# Altium footprint library elk-pi-Sika_revb.PcbLib: 102 footprints (part 3 of 7)
Each footprint in its own frame and in the unit in brackets; x right, y up, seen from the top. Pads: shape width x height; smd on the part's side, far side on the other; paste and mask are expansions set on the pad; w line width, h text height; cw(c..) or ccw(c..) is an arc to the next point about the centre after c.
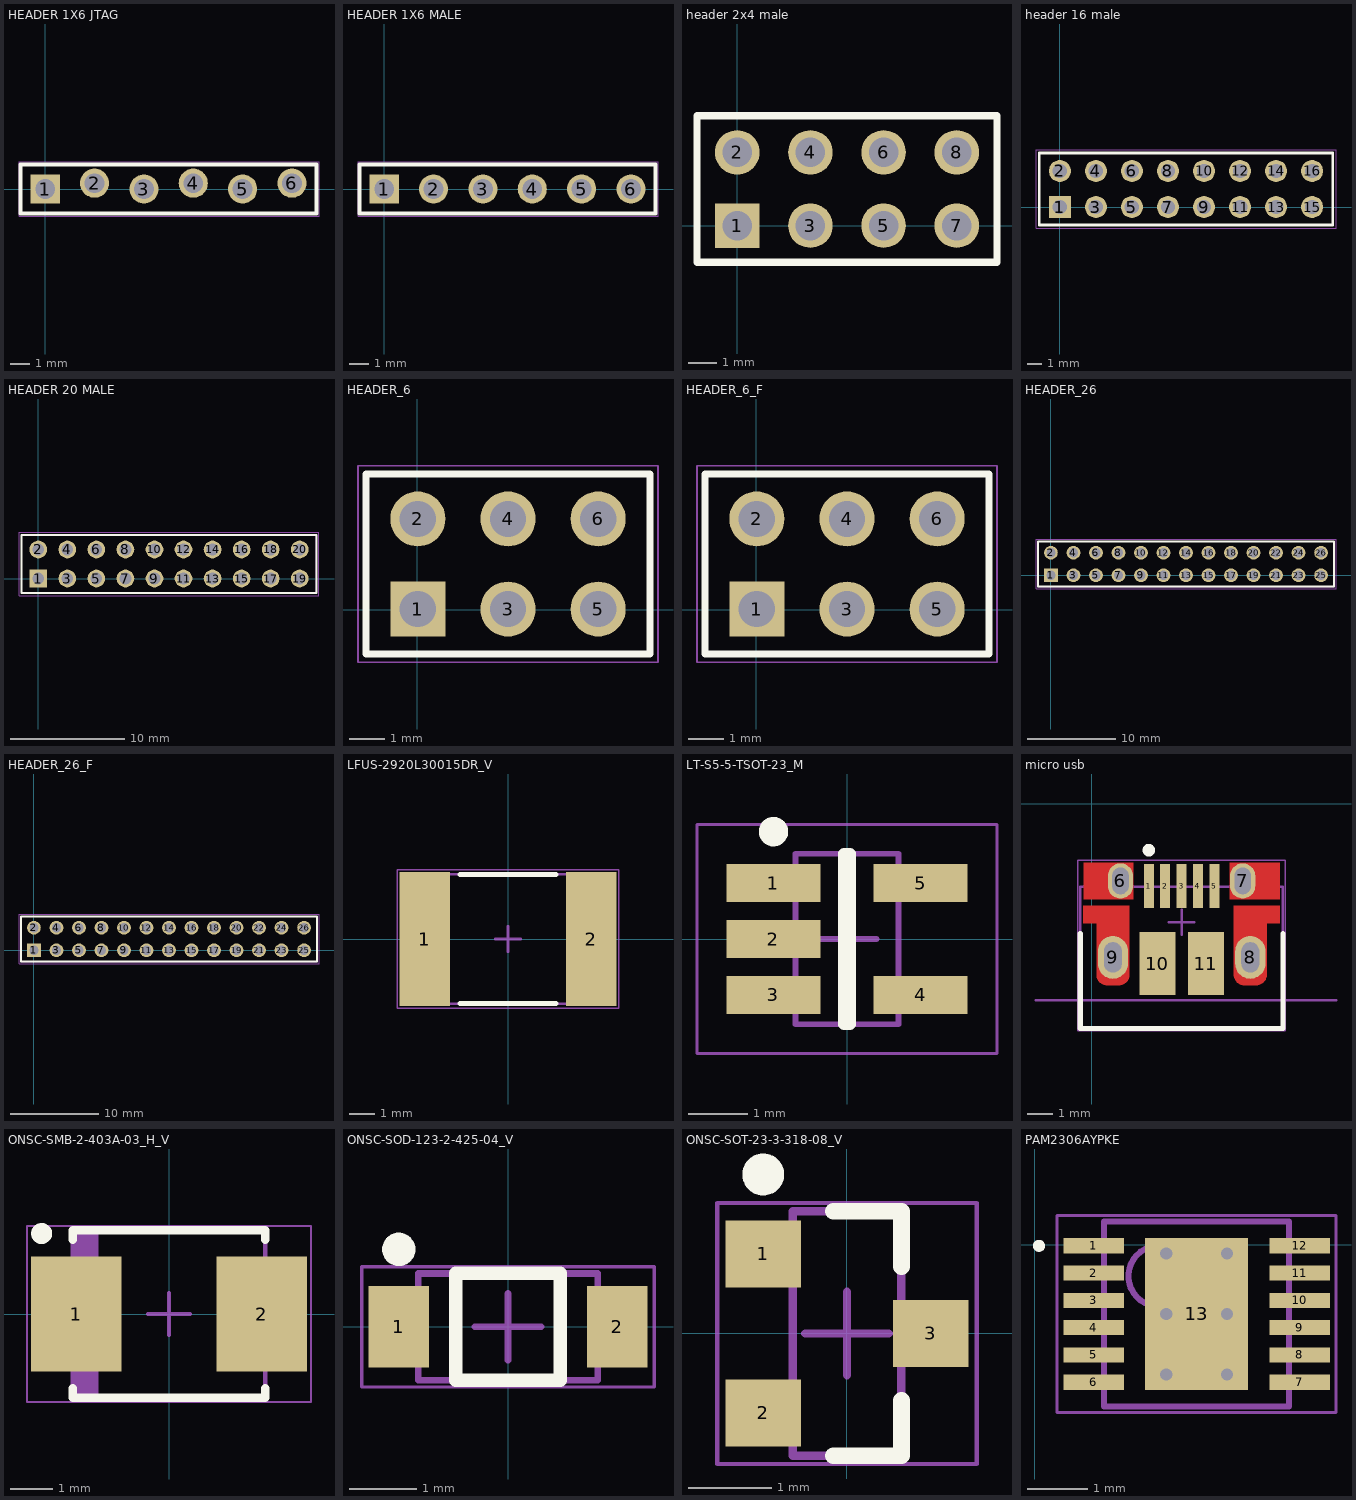
[diagram p2: the footprints below, top view; thin cyan lines are the x and y axes]

## HEADER 1X6 JTAG [mm] "2.54 MM"
height 8.5
pads (6):
  rect 1.5x1.5 hole 1.02: 1(0,0)
  round 1.5 hole 1.02: 2(2.54,0.3) 3(5.08,0) 4(7.62,0.3) 5(10.16,0) 6(12.7,0.3)
Top Overlay:
  lines w0.2: -1.27,-1.27 13.97,-1.27 13.97,1.27 -1.27,1.27 -1.27,-1.27
Mechanical 13:
  lines w0.1: -1.25,-1.3 13.99,-1.3 13.99,1.3 -1.25,1.3 -1.25,-1.3
Mechanical 15:
  lines w0.05: -1.35,-1.4 -1.35,1.4 14.09,1.4 14.09,-1.4 -1.35,-1.4

## HEADER 1X6 MALE [mm] "2.54 MM"
height 8.5
pads (6):
  rect 1.5x1.5 hole 1.02: 1(0,0)
  round 1.5 hole 1.02: 2(2.54,0) 3(5.08,0) 4(7.62,0) 5(10.16,0) 6(12.7,0)
Top Overlay:
  lines w0.2: -1.27,-1.27 13.97,-1.27 13.97,1.27 -1.27,1.27 -1.27,-1.27
Mechanical 13:
  lines w0.1: -1.25,-1.3 13.99,-1.3 13.99,1.3 -1.25,1.3 -1.25,-1.3
Mechanical 15:
  lines w0.05: -1.35,-1.4 -1.35,1.4 14.09,1.4 14.09,-1.4 -1.35,-1.4
3D body "DS1021-1x6S61.stp": height 8.6, standoff -3, extent -1.27,-1.27 13.97,1.27

## header 2x4 male [mm] "header, 2x4 Pins, Vertical, 2.54mm Pitch, Male"
height 9.27
pads (8):
  rect 1.55x1.55 hole 1.02: 1(0,0)
  round 1.55 hole 1.02: 2(0,2.54) 3(2.54,0) 4(2.54,2.54) 5(5.08,0) 6(5.08,2.54) 7(7.62,0) 8(7.62,2.54)
Top Overlay:
  lines w0.254: -1.397,-1.27 9.017,-1.27 9.017,3.81 -1.397,3.81 -1.397,-1.27
3D body "DS1021-2x4S61.stp": height 8.6, standoff -3, extent -1.27,-1.23 8.89,3.77

## header 16 male [mm] "unshrouded"
height 28.65
pads (16):
  rect 1.55x1.55 hole 1.02: 1(0,0)
  round 1.55 hole 1.02: 2(0,2.54) 3(2.54,0) 4(2.54,2.54) 5(5.08,0) 6(5.08,2.54) 7(7.62,0) 8(7.62,2.54) 9(10.16,0) 10(10.16,2.54) 11(12.7,0) 12(12.7,2.54) 13(15.24,0) 14(15.24,2.54) 15(17.78,0) 16(17.78,2.54)
Top Overlay:
  lines w0.2: -1.46,-1.27 19.24,-1.27 19.24,3.81 -1.46,3.81 -1.46,-1.27
Mechanical 13:
  lines w0.1: -1.46,-1.27 19.24,-1.27 19.24,3.81 -1.46,3.81 -1.46,-1.27
Mechanical 15:
  lines w0.05: -1.685,-1.495 19.465,-1.495 19.465,4.035 -1.685,4.035 -1.685,-1.495
3D body "DS1021-2x8S61.stp": height 8.6, standoff -3, extent -1.275,-1.175 19.045,3.825

## HEADER 20 MALE [mm] "2.54 MM"
height 3.327
pads (20):
  rect 1.55x1.55 hole 1.02: 1(0,0)
  round 1.55 hole 1.02: 2(0,2.54) 3(2.54,0) 4(2.54,2.54) 5(5.08,0) 6(5.08,2.54) 7(7.62,0) 8(7.62,2.54) 9(10.16,0) 10(10.16,2.54) 11(12.7,0) 12(12.7,2.54) 13(15.24,0) 14(15.24,2.54) 15(17.78,0) 16(17.78,2.54) 17(20.32,0) 18(20.32,2.54) 19(22.86,0) 20(22.86,2.54)
Top Overlay:
  lines w0.2: -1.46,-1.27 -1.46,3.81 24.32,3.81 24.32,-1.27 -1.46,-1.27
Mechanical 13:
  lines w0.1: -1.46,-1.27 24.32,-1.27 24.32,3.81 -1.46,3.81 -1.46,-1.27
Mechanical 15:
  lines w0.05: -1.685,-1.495 -1.685,4.035 24.545,4.035 24.545,-1.495 -1.685,-1.495
3D body "DS1021-2x10S61.stp": height 8.6, standoff -3, extent -1.27,-1.23 24.13,3.77

## HEADER_6 [mm] "2.54 MM"
height 8.5
pads (6):
  rect 1.55x1.55 hole 1.02: 1(0.022,0.02)
  round 1.55 hole 1.02: 2(0.022,2.56) 3(2.562,0.02) 4(2.562,2.56) 5(5.102,0.02) 6(5.102,2.56)
Top Overlay:
  lines w0.2: -1.438,-1.25 6.562,-1.25 6.562,3.83 -1.438,3.83 -1.438,-1.25
Mechanical 13:
  lines w0.1: -1.438,-1.25 6.562,-1.25 6.562,3.83 -1.438,3.83 -1.438,-1.25
Mechanical 15:
  lines w0.05: -1.663,-1.475 6.787,-1.475 6.787,4.055 -1.663,4.055 -1.663,-1.475
3D body "m20-9980345_asm.stp": height 8.65, standoff -3.03, extent -1.248,-1.3 6.372,3.78

## HEADER_6_F [mm] "2.54 MM"
height 8.5
pads (6):
  rect 1.55x1.55 hole 1.02: 1(0.022,0.02)
  round 1.55 hole 1.02: 2(0.022,2.56) 3(2.562,0.02) 4(2.562,2.56) 5(5.102,0.02) 6(5.102,2.56)
Top Overlay:
  lines w0.2: -1.438,-1.25 -1.438,3.83 6.562,3.83 6.562,-1.25 -1.438,-1.25
Mechanical 13:
  lines w0.1: -1.438,-1.25 -1.438,3.83 6.562,3.83 6.562,-1.25 -1.438,-1.25
Mechanical 15:
  lines w0.05: -1.663,-1.475 -1.663,4.055 6.787,4.055 6.787,-1.475 -1.663,-1.475
3D body "m20-7830346_asm.stp": height 8.51, standoff -2.99, extent -1.448,-1.3 6.572,3.74

## HEADER_26 [mm] "Assembly .025\" [.64] SQ Post Terminal Strip, 2x13 Pins, Vertical, 2.54mm Pitch, Male"
height 5.41
pads (26):
  rect 1.55x1.55 hole 1.02: 1(0,0)
  round 1.55 hole 1.02: 2(0,2.54) 3(2.54,0) 4(2.54,2.54) 5(5.08,0) 6(5.08,2.54) 7(7.62,0) 8(7.62,2.54) 9(10.16,0) 10(10.16,2.54) 11(12.7,0) 12(12.7,2.54) 13(15.24,0) 14(15.24,2.54) 15(17.78,0) 16(17.78,2.54) 17(20.32,0) 18(20.32,2.54) 19(22.86,0) 20(22.86,2.54) 21(25.4,0) 22(25.4,2.54) 23(27.94,0) 24(27.94,2.54) 25(30.48,0) 26(30.48,2.54)
Top Overlay:
  lines w0.2: -1.46,-1.27 31.94,-1.27 31.94,3.81 -1.46,3.81 -1.46,-1.27
Mechanical 13:
  lines w0.1: -1.46,-1.27 31.94,-1.27 31.94,3.81 -1.46,3.81 -1.46,-1.27
Mechanical 15:
  lines w0.05: -1.685,-1.495 32.165,-1.495 32.165,4.035 -1.685,4.035 -1.685,-1.495
3D body "m20-9981345_asm.stp": height 8.65, standoff -3.03, extent -1.27,-1.3 31.75,3.78

## HEADER_26_F [mm] "Assembly .025\" [.64] SQ Post Terminal Strip, 2x13 Pins, Vertical, 2.54mm Pitch, Male"
height 5.41
pads (26):
  rect 1.55x1.55 hole 1.02: 1(0,0)
  round 1.55 hole 1.02: 2(0,2.54) 3(2.54,0) 4(2.54,2.54) 5(5.08,0) 6(5.08,2.54) 7(7.62,0) 8(7.62,2.54) 9(10.16,0) 10(10.16,2.54) 11(12.7,0) 12(12.7,2.54) 13(15.24,0) 14(15.24,2.54) 15(17.78,0) 16(17.78,2.54) 17(20.32,0) 18(20.32,2.54) 19(22.86,0) 20(22.86,2.54) 21(25.4,0) 22(25.4,2.54) 23(27.94,0) 24(27.94,2.54) 25(30.48,0) 26(30.48,2.54)
Top Overlay:
  lines w0.2: -1.46,-1.27 31.94,-1.27 31.94,3.81 -1.46,3.81 -1.46,-1.27
Mechanical 13:
  lines w0.1: -1.46,-1.27 31.94,-1.27 31.94,3.81 -1.46,3.81 -1.46,-1.27
Mechanical 15:
  lines w0.05: -1.685,-1.495 32.165,-1.495 32.165,4.035 -1.685,4.035 -1.685,-1.495
3D body "m20-7831342_asm.stp": height 8.51, standoff -2.99, extent -1.52,-1.32 31.9,3.72

## LFUS-2920L30015DR_V [mm] "SMD, 2-Leads, Body 5.12x7.355mm"
height 1.25
pads (2):
  rect 2x5.3 smd: 1(-3.3,0) 2(3.3,0)
Top Overlay:
  lines w0.2: -1.9,-2.56 1.9,-2.56 ; -1.9,2.56 1.9,2.56
Mechanical 13:
  lines w0.1: -3.678,-2.56 3.678,-2.56 3.678,2.56 -3.678,2.56 -3.678,-2.56
Mechanical 15:
  lines w0.05: -4.4,-2.75 4.4,-2.75 4.4,2.75 -4.4,2.75 -4.4,-2.75
  lines w0.1: -0.5,0 0.5,0 ; 0,-0.5 0,0.5
3D body: height 1.25, standoff 0, extent -3.677,-2.559 3.677,2.559

## LT-S5-5-TSOT-23_M [mm] "SOT23, 5-Leads, Body 2.90x1.63mm, Pitch 0.95mm, IPC Low Density"
height 1
pads (5):
  rect 1.6x0.65 smd: 1(-1.25,0.95) 2(-1.25,0) 3(-1.25,-0.95) 4(1.25,-0.95) 5(1.25,0.95)
Top Overlay:
  circle w0.25: c-1.25,1.825 r0.125
  lines w0.2: -0.05,-1.45 0.05,-1.45 0.05,1.45 -0.05,1.45 -0.05,-1.45
Mechanical 13:
  lines w0.1: -0.875,-1.45 -0.875,1.45 0.875,1.45 0.875,-1.45 -0.875,-1.45
Mechanical 15:
  lines w0.05: -2.55,-1.95 -2.55,1.95 2.55,1.95 2.55,-1.95 -2.55,-1.95
  lines w0.1: -0.5,0 0.5,0 ; 0,-0.5 0,0.5
3D body: height 1, standoff 0.01, extent -0.875,-1.45 0.875,1.45

## micro usb [mm]
pads (11):
  rect 0.4x1.75 smd: 1(2.256,-3.264) 2(2.906,-3.264) 3(3.556,-3.264) 4(4.206,-3.264) 5(4.856,-3.264)
  oval 1x1.4 hole 0.65 slot 1.05 at 90 deg: 6(1.131,-3.059) 7(5.981,-3.059)
  oval 1.2x1.7 hole 0.7 slot 1.2 at 90 deg: 8(6.281,-6.089) 9(0.831,-6.089)
  rect 1.425x2.5 smd: 10(2.594,-6.339) 11(4.518,-6.339)
Top Layer:
  region: 7.456,-2.329 5.456,-2.329 5.456,-3.789 7.456,-3.789
  rectangle: -0.344,-3.789 1.656,-2.329
  region: 6.931,-4.739 6.931,-6.789 6.929,-6.828 6.925,-6.866 6.921,-6.884 6.915,-6.902 6.904,-6.938 6.885,-6.976 6.864,-7.011 6.84,-7.043 6.814,-7.073 6.783,-7.1 6.75,-7.125 6.714,-7.145 6.677,-7.163 6.636,-7.176 6.605,-7.182 6.568,-7.187 6.531,-7.189 6.031,-7.189 5.988,-7.187 5.947,-7.18 5.907,-7.17 5.868,-7.155 5.836,-7.138 5.805,-7.12 5.773,-7.095 5.746,-7.069 5.72,-7.041 5.699,-7.011 5.677,-6.976 5.661,-6.94 5.649,-6.908 5.644,-6.891 5.64,-6.874 5.636,-6.854 5.632,-6.833 5.631,-6.811 5.631,-6.789 5.631,-4.739 5.631,-4.039 7.456,-4.039 7.456,-4.739
  region: 0.181,-4.739 0.181,-6.789 0.183,-6.828 0.187,-6.866 0.191,-6.884 0.197,-6.902 0.208,-6.938 0.227,-6.976 0.248,-7.011 0.272,-7.043 0.298,-7.073 0.329,-7.1 0.362,-7.125 0.398,-7.145 0.435,-7.163 0.476,-7.176 0.507,-7.182 0.544,-7.187 0.581,-7.189 1.081,-7.189 1.124,-7.187 1.165,-7.181 1.205,-7.17 1.244,-7.155 1.276,-7.138 1.307,-7.12 1.339,-7.096 1.366,-7.069 1.392,-7.041 1.413,-7.011 1.435,-6.976 1.451,-6.94 1.463,-6.908 1.468,-6.891 1.472,-6.874 1.476,-6.854 1.48,-6.833 1.481,-6.811 1.481,-6.789 1.481,-4.739 1.481,-4.039 -0.344,-4.039 -0.344,-4.739
Top Overlay:
  circle w0.25: c2.256,-1.839 r0.125
  lines w0.2: -0.464,-6.776 -0.464,-8.909 ; -0.464,-5.139 -0.464,-8.909 ; 7.576,-5.139 7.576,-8.909 -0.464,-8.909
Mechanical 1:
  lines w0.1: -2.219,-7.789 9.681,-7.789
  text "PCB Edge" at 7.981,-7.529 h0.75
Mechanical 13:
  lines w0.1: -0.464,-8.909 -0.464,-3.289 7.576,-3.289 7.576,-8.909 -0.464,-8.909
Mechanical 15:
  lines w0.05: -0.564,-9.009 -0.564,-2.229 7.676,-2.229 7.676,-9.009 -0.564,-9.009
  lines w0.1: 3.056,-4.699 4.056,-4.699 ; 3.556,-5.199 3.556,-4.199
3D body "10103594.stp": height 2.9, standoff -0.7, extent -0.464,-8.848 7.576,-2.815

## ONSC-SMB-2-403A-03_H_V [mm] "Molded, 2-Leads, Body 4.6x3.95mm"
height 2.42
pads (2):
  rect 2.159x2.743 smd: 1(-2.21,0) 2(2.21,0)
Top Overlay:
  circle w0.25: c-3.04,1.921 r0.125
  lines w0.2: -2.3,-1.772 -2.3,-2 2.3,-2 2.3,-1.772 ; -2.3,1.772 -2.3,2 2.3,2 2.3,1.772
Mechanical 13:
  rectangle: -2.3,-1.975 -1.681,1.975
  lines w0.1: -2.3,-1.975 -2.3,1.975 2.3,1.975 2.3,-1.975 -2.3,-1.975
Mechanical 15:
  lines w0.05: -3.39,-2.1 -3.39,2.1 3.39,2.1 3.39,-2.1 -3.39,-2.1
  lines w0.1: -0.5,0 0.5,0 ; 0,-0.5 0,0.5
3D body: height 2.42, standoff 0, extent -2.3,-1.975 2.3,1.975

## ONSC-SOD-123-2-425-04_V [mm] "SOD, 2-Leads, Body 2.69x1.6mm"
height 1.35
pads (2):
  rect 0.91x1.22 smd: 1(-1.635,0) 2(1.635,0)
Top Overlay:
  circle w0.25: c-1.635,1.16 r0.125
  lines w0.2: -0.78,-0.8 0.78,-0.8 0.78,0.8 -0.78,0.8 -0.78,-0.8
Mechanical 13:
  lines w0.1: -1.345,-0.8 1.345,-0.8 1.345,0.8 -1.345,0.8 -1.345,-0.8
Mechanical 15:
  lines w0.05: -2.19,-0.9 2.19,-0.9 2.19,0.9 -2.19,0.9 -2.19,-0.9
  lines w0.1: -0.5,0 0.5,0 ; 0,-0.5 0,0.5
3D body: height 1.35, standoff 0, extent -1.345,-0.8 1.345,0.8

## ONSC-SOT-23-3-318-08_V [mm] "SOT23, 3-Leads, Body 2.92x1.3mm, Pitch 0.95mm"
height 1.11
pads (3):
  rect 0.9x0.8 smd: 1(-1,0.95) 2(-1,-0.95) 3(1,0)
Top Overlay:
  circle w0.25: c-1,1.9 r0.125
  lines w0.2: -0.165,-1.46 0.65,-1.46 0.65,-0.8 ; -0.165,1.46 0.65,1.46 0.65,0.8
Mechanical 13:
  lines w0.1: -0.65,-1.46 0.65,-1.46 0.65,1.46 -0.65,1.46 -0.65,-1.46
Mechanical 15:
  lines w0.05: -1.55,-1.56 1.55,-1.56 1.55,1.56 -1.55,1.56 -1.55,-1.56
  lines w0.1: -0.5,0 0.5,0 ; 0,-0.5 0,0.5
3D body: height 1.11, standoff 0.01, extent -0.65,-1.46 0.65,1.46

## PAM2306AYPKE [mm]
pads (13):
  rect 1x0.25 smd: 1(0.967,-0.018) 2(0.967,-0.468) 3(0.967,-0.918) 4(0.967,-1.368) 5(0.967,-1.818) 6(0.967,-2.268) 7(4.367,-2.268) 8(4.367,-1.818) 9(4.367,-1.368) 10(4.367,-0.918) 11(4.367,-0.468) 12(4.367,-0.018)
  rect 1.7x2.5 smd: 13(2.667,-1.143)
via 2.167,-0.143 diameter 0.5 hole 0.2
via 3.167,-0.143 diameter 0.5 hole 0.2
via 2.167,-1.143 diameter 0.5 hole 0.2
via 3.167,-1.143 diameter 0.5 hole 0.2
via 2.167,-2.143 diameter 0.5 hole 0.2
via 3.167,-2.143 diameter 0.5 hole 0.2
Top Overlay:
  circle w0.1: c0.067,-0.018 r0.05
Mechanical 13:
  circle w0.1: c2.042,-0.518 r0.5
  lines w0.1: 1.142,-2.668 1.142,0.382 4.192,0.382 4.192,-2.668 1.142,-2.668
Mechanical 15:
  lines w0.05: 0.367,-2.768 0.367,0.482 4.967,0.482 4.967,-2.768 0.367,-2.768
  lines w0.1: 2.167,-1.143 3.167,-1.143 ; 2.667,-1.643 2.667,-0.643
3D body "SON45P300X80_HS-13L.step": height 0.8, standoff 0, extent 1.142,-2.668 4.192,0.382